# Altium footprint library PCB_ConnectorHDR.PcbLib: 134 footprints (part 9 of 9)
Each footprint in its own frame and in the unit in brackets; x right, y up, seen from the top. Pads: shape width x height; smd on the part's side, far side on the other; paste and mask are expansions set on the pad; w line width, h text height; cw(c..) or ccw(c..) is an arc to the next point about the centre after c.
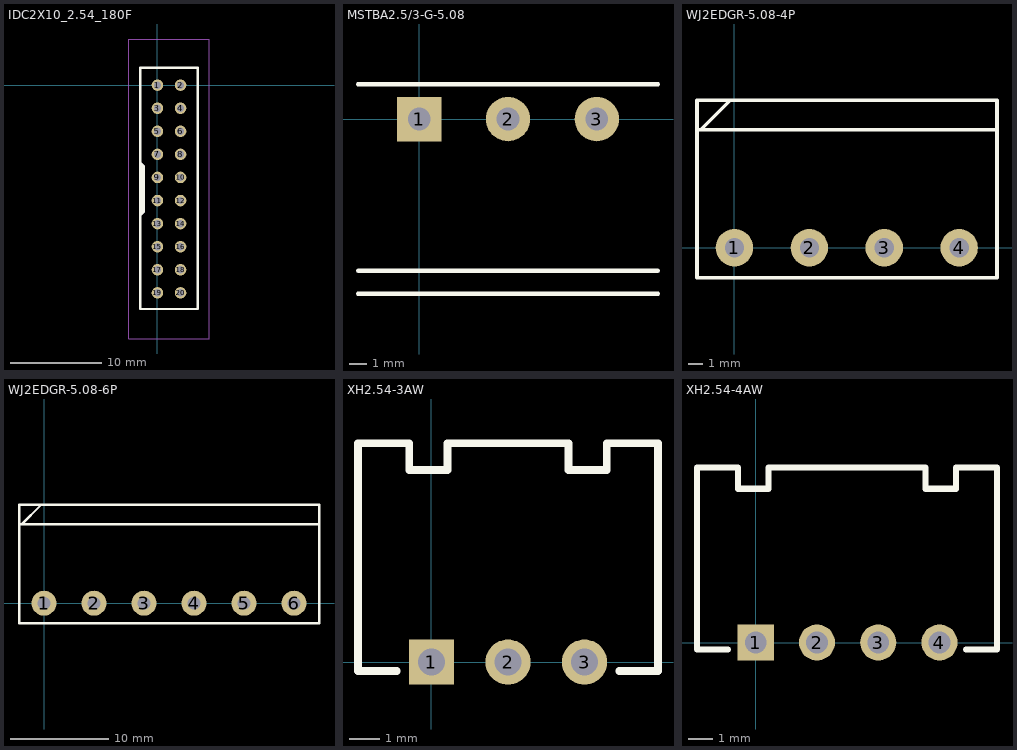
[diagram p8: the footprints below, top view; thin cyan lines are the x and y axes]

## IDC2X10_2.54_180F [mil]
height 169.29
pads (20):
  round 50 hole 32: 1(0,0) 2(100,0) 3(0,-100) 4(100,-100) 5(0,-200) 6(100,-200) 7(0,-300) 8(100,-300) 9(0,-400) 10(100,-400) 11(0,-500) 12(100,-500) 13(0,-600) 14(100,-600) 15(0,-700) 16(100,-700) 17(0,-800) 18(100,-800) 19(0,-900) 20(100,-900)
Top Overlay:
  region: -75,-335 -75,-565 -60,-550 -60,-350
  lines w10: -75,-565 -60,-550 -60,-350 -75,-335 ; -75,-565 -75,-970 175,-970 175,75 -75,75 -75,-335 ; -75,-565 -75,-335
Mechanical 13:
  lines w2: -125,-1100 225,-1100 225,200 -125,200 -125,-1100
T-Component:
  lines w2: -125,-1100 -125,200 225,200 225,-1100 -125,-1100
3D body "SW3dPS-PinBox Connector_20Pin.STEP": height 429.13, standoff -118.11, extent -123.23,-1100 223.23,199.21

## MSTBA2.5/3-G-5.08 [mm]
pads (3):
  rect 2.54x2.54 hole 1.3: 1(0,0)
  round 2.54 hole 1.3: 2(5.08,0) 3(10.16,0)
Top Overlay:
  lines w0.254: -3.5,-10 13.66,-10 ; -3.5,2 13.66,2 ; -3.48,-8.665 13.64,-8.665
3D body "1757255.stp": height 8.63, standoff -3.47, extent -3.473,-9.945 13.767,2.057

## WJ2EDGR-5.08-4P [mm]
pads (4):
  round 2.54 hole 1.3: 1(0,0) 2(5.08,0) 3(10.16,0) 4(15.24,0)
Top Overlay:
  lines w0.254: -2.54,8.197 -2.54,8 17.805,8 ; -2.337,8 -2.279,8 -0.279,10 ; -2.54,-2.032 17.805,-2.032 17.805,10 -2.54,10 -2.54,-2.032
3D body "User Library-MSTB 2,5-4-G-5,08 1759033.STEP": height 8.6, standoff -3.5, extent -2.515,-1.995 17.805,10.008

## WJ2EDGR-5.08-6P [mm]
pads (6):
  round 2.54 hole 1.3: 1(0,0) 2(5.08,0) 3(10.16,0) 4(15.24,0) 5(20.32,0) 6(25.4,0)
Top Overlay:
  lines w0.254: -2.54,8.197 -2.54,8 27.94,8 ; -2.337,8 -2.279,8 -0.279,10 ; -2.54,-2.032 27.94,-2.032 27.94,10 -2.54,10 -2.54,-2.032
3D body "User Library-MSTB 2,5-6-G-5,08 1759059.STEP": height 8.6, standoff -3.5, extent -2.54,-1.937 27.94,10.065

## XH2.54-3AW [mm]
pads (3):
  rect 1.5x1.5 hole 0.9: 1(0,0)
  round 1.5 hole 0.9: 2(2.54,0) 3(5.08,0)
Top Overlay:
  lines w0.254: -1.154,-0.294 -2.438,-0.294 -2.438,7.264 -0.737,7.264 -0.737,6.377 0.533,6.377 0.533,7.264 4.547,7.264 4.547,6.377 5.817,6.377 5.817,7.264 7.518,7.264 7.518,-0.294 6.234,-0.294

## XH2.54-4AW [mm]
pads (4):
  rect 1.5x1.5 hole 0.9: 1(0,0)
  round 1.5 hole 0.9: 2(2.54,0) 3(5.08,0) 4(7.62,0)
Top Overlay:
  lines w0.254: -1.154,-0.294 -2.438,-0.294 -2.438,7.264 -0.737,7.264 -0.737,6.377 0.533,6.377 0.533,7.264 7.036,7.264 7.036,6.377 8.306,6.377 8.306,7.264 10.008,7.264 ; 8.722,-0.295 10.006,-0.295 10.006,7.263
3D body "User Library-XH2_54-4P-AW.step": height 5.9, standoff -3, extent -2.44,-0.295 10.06,7.305